# Altium integrated library Weidmueller_OMNIMATE_Power.IntLib: 508 symbols (part 2 of 9)
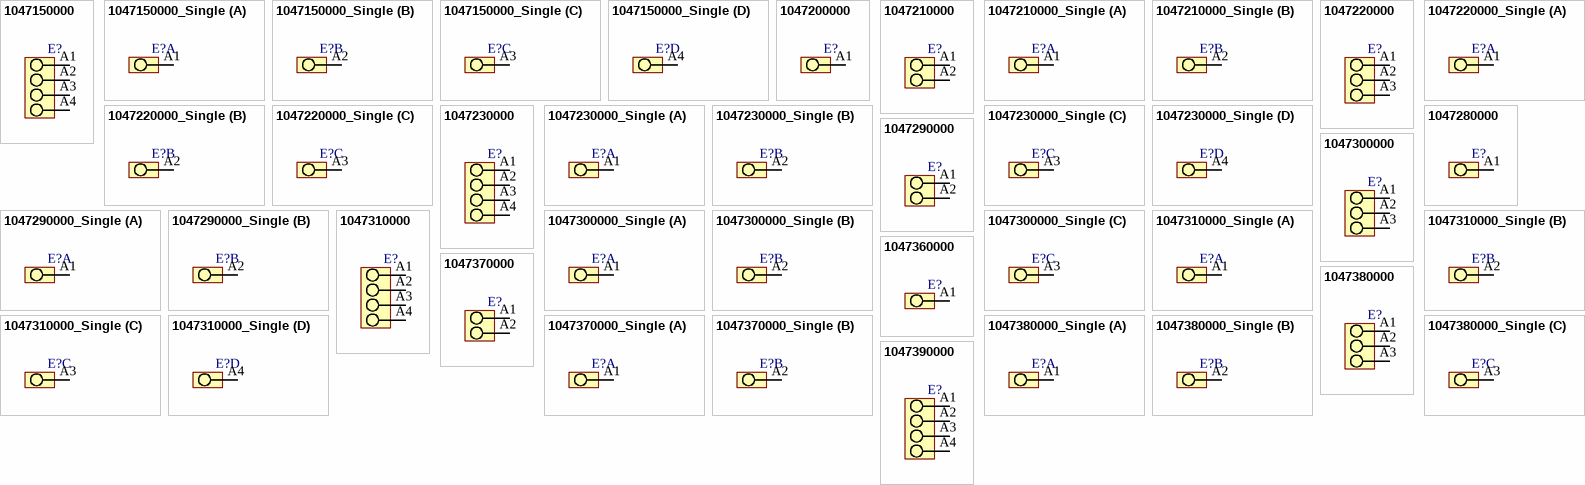
[diagram p32: symbols 1047150000 to 1047390000]

## 1047380000
designator E?
OMNIMATE Power - series LXXX; PartNumber: 1047380000; Manufacturer: Weidmueller; Short_text_for_material: LXXX 15.00/03/90F 4.5SN GY BX; Side_termination_characteristic: Flange; Mounting_onto_the_PCB: Solder connection; Pitch_mm: 15 mm; Pitch_inch: 0,591 inch; No_of_poles: 3; Solder_pin_length_mm: 4,5 mm; Contact_material: Cu-Leg; Contact_surface: tinned; Insulating_material: Wemid (PA); UL_94_flammability_rating: V-0; Rated_voltage_for_surge_voltage_class_pollution_degree_II_2: 1000 V; Rated_current_min_no_of_poles_TU_20_deg_C: 150 A; Solid_min_H05_07_V_U: 0,5 mm²; Solid_max_H05_07_V_U: 16 mm²; Rated_voltage_use_group_B_UL_1059: 600 V; Rated_current_use_group_B_UL_1059: 127 A; Wire_cross_section_AWG_min_UL_1059: AWG 20; Wire_cross_section_AWG_max_UL_1059: AWG 1; PackageReference: LXXX_15_00_90F_03; Colour: Pebble grey; Packaging: Box; Qty: 10 PCS; Revision: V1; ComponentLink1Description: Manufacturer URL; ComponentLink1URL: http://www.weidmueller.com/; ComponentLink2Description: URL Link1; ComponentLink2URL: http://catalog.weidmueller.com/catalog/Start.do?localeId=en&ObjectID=1047380000
footprint LXXX_15_00_90F_03 (OMNIMATE Power - Serie LXXX  LXXX 15.00/03/90F 4.5)
pins: A1, A2, A3
1 alternate drawing of the same symbol

## 1047380000_Single
designator E?
OMNIMATE Power - series LXXX; PartNumber: 1047380000; Manufacturer: Weidmueller; Short_text_for_material: LXXX 15.00/03/90F 4.5SN GY BX; Side_termination_characteristic: Flange; Mounting_onto_the_PCB: Solder connection; Pitch_mm: 15 mm; Pitch_inch: 0,591 inch; No_of_poles: 3; Solder_pin_length_mm: 4,5 mm; Contact_material: Cu-Leg; Contact_surface: tinned; Insulating_material: Wemid (PA); UL_94_flammability_rating: V-0; Rated_voltage_for_surge_voltage_class_pollution_degree_II_2: 1000 V; Rated_current_min_no_of_poles_TU_20_deg_C: 150 A; Solid_min_H05_07_V_U: 0,5 mm²; Solid_max_H05_07_V_U: 16 mm²; Rated_voltage_use_group_B_UL_1059: 600 V; Rated_current_use_group_B_UL_1059: 127 A; Wire_cross_section_AWG_min_UL_1059: AWG 20; Wire_cross_section_AWG_max_UL_1059: AWG 1; PackageReference: LXXX_15_00_90F_03; Colour: Pebble grey; Packaging: Box; Qty: 10 PCS; Revision: V1; ComponentLink1Description: Manufacturer URL; ComponentLink1URL: http://www.weidmueller.com/; ComponentLink2Description: URL Link1; ComponentLink2URL: http://catalog.weidmueller.com/catalog/Start.do?localeId=en&ObjectID=1047380000
footprint LXXX_15_00_90F_03 (OMNIMATE Power - Serie LXXX  LXXX 15.00/03/90F 4.5)
part A pins: A1
part B pins: A2
part C pins: A3
1 alternate drawing of the same symbol

## 1047390000
designator E?
OMNIMATE Power - series LXXX; PartNumber: 1047390000; Manufacturer: Weidmueller; Short_text_for_material: LXXX 15.00/04/90F 4.5SN GY BX; Side_termination_characteristic: Flange; Mounting_onto_the_PCB: Solder connection; Pitch_mm: 15 mm; Pitch_inch: 0,591 inch; No_of_poles: 4; Solder_pin_length_mm: 4,5 mm; Contact_material: Cu-Leg; Contact_surface: tinned; Insulating_material: Wemid (PA); UL_94_flammability_rating: V-0; Rated_voltage_for_surge_voltage_class_pollution_degree_II_2: 1000 V; Rated_current_min_no_of_poles_TU_20_deg_C: 150 A; Solid_min_H05_07_V_U: 0,5 mm²; Solid_max_H05_07_V_U: 16 mm²; Rated_voltage_use_group_B_UL_1059: 600 V; Rated_current_use_group_B_UL_1059: 127 A; Wire_cross_section_AWG_min_UL_1059: AWG 20; Wire_cross_section_AWG_max_UL_1059: AWG 1; PackageReference: LXXX_15_00_90F_04; Colour: Pebble grey; Packaging: Box; Qty: 10 PCS; Revision: V1; ComponentLink1Description: Manufacturer URL; ComponentLink1URL: http://www.weidmueller.com/; ComponentLink2Description: URL Link1; ComponentLink2URL: http://catalog.weidmueller.com/catalog/Start.do?localeId=en&ObjectID=1047390000
footprint LXXX_15_00_90F_04 (OMNIMATE Power - Serie LXXX  LXXX 15.00/04/90F 4.5)
pins: A1, A2, A3, A4
1 alternate drawing of the same symbol

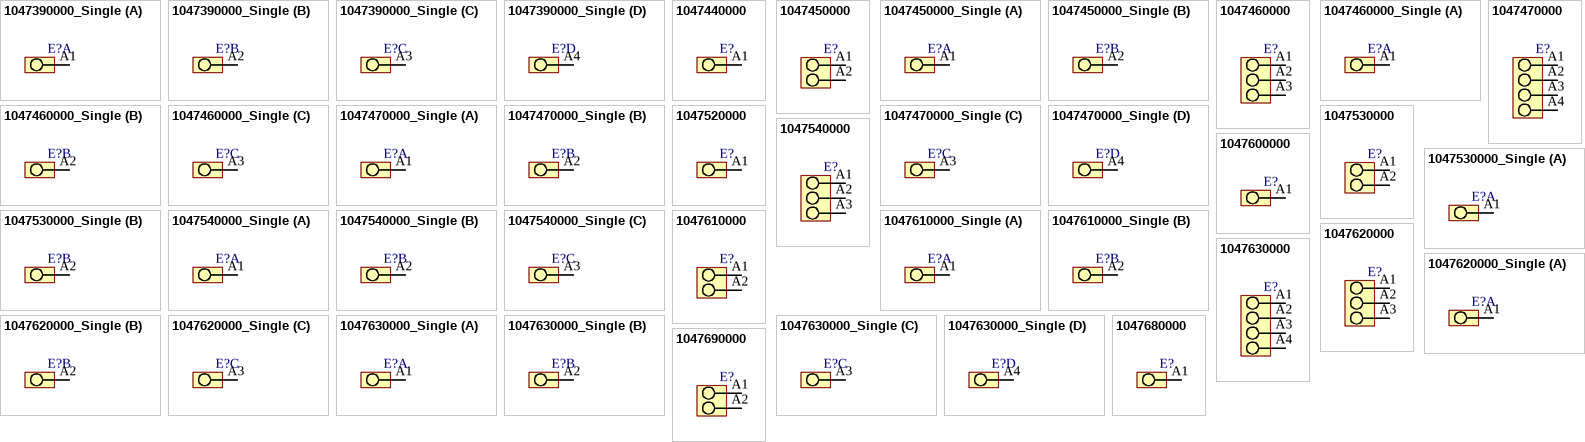
[diagram p3: symbols 1047390000_Single to 1047690000]

## 1047390000_Single
designator E?
OMNIMATE Power - series LXXX; PartNumber: 1047390000; Manufacturer: Weidmueller; Short_text_for_material: LXXX 15.00/04/90F 4.5SN GY BX; Side_termination_characteristic: Flange; Mounting_onto_the_PCB: Solder connection; Pitch_mm: 15 mm; Pitch_inch: 0,591 inch; No_of_poles: 4; Solder_pin_length_mm: 4,5 mm; Contact_material: Cu-Leg; Contact_surface: tinned; Insulating_material: Wemid (PA); UL_94_flammability_rating: V-0; Rated_voltage_for_surge_voltage_class_pollution_degree_II_2: 1000 V; Rated_current_min_no_of_poles_TU_20_deg_C: 150 A; Solid_min_H05_07_V_U: 0,5 mm²; Solid_max_H05_07_V_U: 16 mm²; Rated_voltage_use_group_B_UL_1059: 600 V; Rated_current_use_group_B_UL_1059: 127 A; Wire_cross_section_AWG_min_UL_1059: AWG 20; Wire_cross_section_AWG_max_UL_1059: AWG 1; PackageReference: LXXX_15_00_90F_04; Colour: Pebble grey; Packaging: Box; Qty: 10 PCS; Revision: V1; ComponentLink1Description: Manufacturer URL; ComponentLink1URL: http://www.weidmueller.com/; ComponentLink2Description: URL Link1; ComponentLink2URL: http://catalog.weidmueller.com/catalog/Start.do?localeId=en&ObjectID=1047390000
footprint LXXX_15_00_90F_04 (OMNIMATE Power - Serie LXXX  LXXX 15.00/04/90F 4.5)
part A pins: A1
part B pins: A2
part C pins: A3
part D pins: A4
1 alternate drawing of the same symbol

## 1047440000
designator E?
OMNIMATE Power - series LXXX; PartNumber: 1047440000; Manufacturer: Weidmueller; Short_text_for_material: LXXX 15.00/01/90FL 4.5SN BK BX; Side_termination_characteristic: Flange on left; Mounting_onto_the_PCB: Solder connection; Pitch_mm: 15 mm; Pitch_inch: 0,591 inch; No_of_poles: 1; Solder_pin_length_mm: 4,5 mm; Contact_material: Cu-Leg; Contact_surface: tinned; Insulating_material: Wemid (PA); UL_94_flammability_rating: V-0; Rated_voltage_for_surge_voltage_class_pollution_degree_II_2: 1000 V; Solid_min_H05_07_V_U: 0,5 mm²; Solid_max_H05_07_V_U: 16 mm²; Rated_voltage_use_group_B_UL_1059: 600 V; Rated_current_use_group_B_UL_1059: 127 A; Wire_cross_section_AWG_min_UL_1059: AWG 20; Wire_cross_section_AWG_max_UL_1059: AWG 1; PackageReference: LXXX_15_00_90FL_01; Colour: Black; Packaging: Box; Qty: 20 PCS; Revision: V1; ComponentLink1Description: Manufacturer URL; ComponentLink1URL: http://www.weidmueller.com/; ComponentLink2Description: URL Link1; ComponentLink2URL: http://catalog.weidmueller.com/catalog/Start.do?localeId=en&ObjectID=1047440000
footprint LXXX_15_00_90FL_01 (OMNIMATE Power - Serie LXXX  LXXX 15.00/01/90FL 4.5)
pins: A1
1 alternate drawing of the same symbol

## 1047450000
designator E?
OMNIMATE Power - series LXXX; PartNumber: 1047450000; Manufacturer: Weidmueller; Short_text_for_material: LXXX 15.00/02/90FL 4.5SN BK BX; Side_termination_characteristic: Flange on left; Mounting_onto_the_PCB: Solder connection; Pitch_mm: 15 mm; Pitch_inch: 0,591 inch; No_of_poles: 2; Solder_pin_length_mm: 4,5 mm; Contact_material: Cu-Leg; Contact_surface: tinned; Insulating_material: Wemid (PA); UL_94_flammability_rating: V-0; Rated_voltage_for_surge_voltage_class_pollution_degree_II_2: 1000 V; Solid_min_H05_07_V_U: 0,5 mm²; Solid_max_H05_07_V_U: 16 mm²; Rated_voltage_use_group_B_UL_1059: 600 V; Rated_current_use_group_B_UL_1059: 127 A; Wire_cross_section_AWG_min_UL_1059: AWG 20; Wire_cross_section_AWG_max_UL_1059: AWG 1; PackageReference: LXXX_15_00_90FL_02; Colour: Black; Packaging: Box; Qty: 20 PCS; Revision: V1; ComponentLink1Description: Manufacturer URL; ComponentLink1URL: http://www.weidmueller.com/; ComponentLink2Description: URL Link1; ComponentLink2URL: http://catalog.weidmueller.com/catalog/Start.do?localeId=en&ObjectID=1047450000
footprint LXXX_15_00_90FL_02 (OMNIMATE Power - Serie LXXX  LXXX 15.00/02/90FL 4.5)
pins: A1, A2
1 alternate drawing of the same symbol

## 1047450000_Single
designator E?
OMNIMATE Power - series LXXX; PartNumber: 1047450000; Manufacturer: Weidmueller; Short_text_for_material: LXXX 15.00/02/90FL 4.5SN BK BX; Side_termination_characteristic: Flange on left; Mounting_onto_the_PCB: Solder connection; Pitch_mm: 15 mm; Pitch_inch: 0,591 inch; No_of_poles: 2; Solder_pin_length_mm: 4,5 mm; Contact_material: Cu-Leg; Contact_surface: tinned; Insulating_material: Wemid (PA); UL_94_flammability_rating: V-0; Rated_voltage_for_surge_voltage_class_pollution_degree_II_2: 1000 V; Solid_min_H05_07_V_U: 0,5 mm²; Solid_max_H05_07_V_U: 16 mm²; Rated_voltage_use_group_B_UL_1059: 600 V; Rated_current_use_group_B_UL_1059: 127 A; Wire_cross_section_AWG_min_UL_1059: AWG 20; Wire_cross_section_AWG_max_UL_1059: AWG 1; PackageReference: LXXX_15_00_90FL_02; Colour: Black; Packaging: Box; Qty: 20 PCS; Revision: V1; ComponentLink1Description: Manufacturer URL; ComponentLink1URL: http://www.weidmueller.com/; ComponentLink2Description: URL Link1; ComponentLink2URL: http://catalog.weidmueller.com/catalog/Start.do?localeId=en&ObjectID=1047450000
footprint LXXX_15_00_90FL_02 (OMNIMATE Power - Serie LXXX  LXXX 15.00/02/90FL 4.5)
part A pins: A1
part B pins: A2
1 alternate drawing of the same symbol

## 1047460000
designator E?
OMNIMATE Power - series LXXX; PartNumber: 1047460000; Manufacturer: Weidmueller; Short_text_for_material: LXXX 15.00/03/90FL 4.5SN BK BX; Side_termination_characteristic: Flange on left; Mounting_onto_the_PCB: Solder connection; Pitch_mm: 15 mm; Pitch_inch: 0,591 inch; No_of_poles: 3; Solder_pin_length_mm: 4,5 mm; Contact_material: Cu-Leg; Contact_surface: tinned; Insulating_material: Wemid (PA); UL_94_flammability_rating: V-0; Rated_voltage_for_surge_voltage_class_pollution_degree_II_2: 1000 V; Solid_min_H05_07_V_U: 0,5 mm²; Solid_max_H05_07_V_U: 16 mm²; Rated_voltage_use_group_B_UL_1059: 600 V; Rated_current_use_group_B_UL_1059: 127 A; Wire_cross_section_AWG_min_UL_1059: AWG 20; Wire_cross_section_AWG_max_UL_1059: AWG 1; PackageReference: LXXX_15_00_90FL_03; Colour: Black; Packaging: Box; Qty: 10 PCS; Revision: V1; ComponentLink1Description: Manufacturer URL; ComponentLink1URL: http://www.weidmueller.com/; ComponentLink2Description: URL Link1; ComponentLink2URL: http://catalog.weidmueller.com/catalog/Start.do?localeId=en&ObjectID=1047460000
footprint LXXX_15_00_90FL_03 (OMNIMATE Power - Serie LXXX  LXXX 15.00/03/90FL 4.5)
pins: A1, A2, A3
1 alternate drawing of the same symbol

## 1047460000_Single
designator E?
OMNIMATE Power - series LXXX; PartNumber: 1047460000; Manufacturer: Weidmueller; Short_text_for_material: LXXX 15.00/03/90FL 4.5SN BK BX; Side_termination_characteristic: Flange on left; Mounting_onto_the_PCB: Solder connection; Pitch_mm: 15 mm; Pitch_inch: 0,591 inch; No_of_poles: 3; Solder_pin_length_mm: 4,5 mm; Contact_material: Cu-Leg; Contact_surface: tinned; Insulating_material: Wemid (PA); UL_94_flammability_rating: V-0; Rated_voltage_for_surge_voltage_class_pollution_degree_II_2: 1000 V; Solid_min_H05_07_V_U: 0,5 mm²; Solid_max_H05_07_V_U: 16 mm²; Rated_voltage_use_group_B_UL_1059: 600 V; Rated_current_use_group_B_UL_1059: 127 A; Wire_cross_section_AWG_min_UL_1059: AWG 20; Wire_cross_section_AWG_max_UL_1059: AWG 1; PackageReference: LXXX_15_00_90FL_03; Colour: Black; Packaging: Box; Qty: 10 PCS; Revision: V1; ComponentLink1Description: Manufacturer URL; ComponentLink1URL: http://www.weidmueller.com/; ComponentLink2Description: URL Link1; ComponentLink2URL: http://catalog.weidmueller.com/catalog/Start.do?localeId=en&ObjectID=1047460000
footprint LXXX_15_00_90FL_03 (OMNIMATE Power - Serie LXXX  LXXX 15.00/03/90FL 4.5)
part A pins: A1
part B pins: A2
part C pins: A3
1 alternate drawing of the same symbol

## 1047470000
designator E?
OMNIMATE Power - series LXXX; PartNumber: 1047470000; Manufacturer: Weidmueller; Short_text_for_material: LXXX 15.00/04/90FL 4.5SN BK BX; Side_termination_characteristic: Flange on left; Mounting_onto_the_PCB: Solder connection; Pitch_mm: 15 mm; Pitch_inch: 0,591 inch; No_of_poles: 4; Solder_pin_length_mm: 4,5 mm; Contact_material: Cu-Leg; Contact_surface: tinned; Insulating_material: Wemid (PA); UL_94_flammability_rating: V-0; Rated_voltage_for_surge_voltage_class_pollution_degree_II_2: 1000 V; Solid_min_H05_07_V_U: 0,5 mm²; Solid_max_H05_07_V_U: 16 mm²; Rated_voltage_use_group_B_UL_1059: 600 V; Rated_current_use_group_B_UL_1059: 127 A; Wire_cross_section_AWG_min_UL_1059: AWG 20; Wire_cross_section_AWG_max_UL_1059: AWG 1; PackageReference: LXXX_15_00_90FL_04; Colour: Black; Packaging: Box; Qty: 10 PCS; Revision: V1; ComponentLink1Description: Manufacturer URL; ComponentLink1URL: http://www.weidmueller.com/; ComponentLink2Description: URL Link1; ComponentLink2URL: http://catalog.weidmueller.com/catalog/Start.do?localeId=en&ObjectID=1047470000
footprint LXXX_15_00_90FL_04 (OMNIMATE Power - Serie LXXX  LXXX 15.00/04/90FL 4.5)
pins: A1, A2, A3, A4
1 alternate drawing of the same symbol

## 1047470000_Single
designator E?
OMNIMATE Power - series LXXX; PartNumber: 1047470000; Manufacturer: Weidmueller; Short_text_for_material: LXXX 15.00/04/90FL 4.5SN BK BX; Side_termination_characteristic: Flange on left; Mounting_onto_the_PCB: Solder connection; Pitch_mm: 15 mm; Pitch_inch: 0,591 inch; No_of_poles: 4; Solder_pin_length_mm: 4,5 mm; Contact_material: Cu-Leg; Contact_surface: tinned; Insulating_material: Wemid (PA); UL_94_flammability_rating: V-0; Rated_voltage_for_surge_voltage_class_pollution_degree_II_2: 1000 V; Solid_min_H05_07_V_U: 0,5 mm²; Solid_max_H05_07_V_U: 16 mm²; Rated_voltage_use_group_B_UL_1059: 600 V; Rated_current_use_group_B_UL_1059: 127 A; Wire_cross_section_AWG_min_UL_1059: AWG 20; Wire_cross_section_AWG_max_UL_1059: AWG 1; PackageReference: LXXX_15_00_90FL_04; Colour: Black; Packaging: Box; Qty: 10 PCS; Revision: V1; ComponentLink1Description: Manufacturer URL; ComponentLink1URL: http://www.weidmueller.com/; ComponentLink2Description: URL Link1; ComponentLink2URL: http://catalog.weidmueller.com/catalog/Start.do?localeId=en&ObjectID=1047470000
footprint LXXX_15_00_90FL_04 (OMNIMATE Power - Serie LXXX  LXXX 15.00/04/90FL 4.5)
part A pins: A1
part B pins: A2
part C pins: A3
part D pins: A4
1 alternate drawing of the same symbol

## 1047520000
designator E?
OMNIMATE Power - series LXXX; PartNumber: 1047520000; Manufacturer: Weidmueller; Short_text_for_material: LXXX 15.00/01/90FL 4.5SN GY BX; Side_termination_characteristic: Flange on left; Mounting_onto_the_PCB: Solder connection; Pitch_mm: 15 mm; Pitch_inch: 0,591 inch; No_of_poles: 1; Solder_pin_length_mm: 4,5 mm; Contact_material: Cu-Leg; Contact_surface: tinned; Insulating_material: Wemid (PA); UL_94_flammability_rating: V-0; Rated_voltage_for_surge_voltage_class_pollution_degree_II_2: 1000 V; Rated_current_min_no_of_poles_TU_20_deg_C: 150 A; Solid_min_H05_07_V_U: 0,5 mm²; Solid_max_H05_07_V_U: 16 mm²; Rated_voltage_use_group_B_UL_1059: 600 V; Rated_current_use_group_B_UL_1059: 127 A; Wire_cross_section_AWG_min_UL_1059: AWG 20; Wire_cross_section_AWG_max_UL_1059: AWG 1; PackageReference: LXXX_15_00_90FL_01; Colour: Pebble grey; Packaging: Box; Qty: 20 PCS; Revision: V1; ComponentLink1Description: Manufacturer URL; ComponentLink1URL: http://www.weidmueller.com/; ComponentLink2Description: URL Link1; ComponentLink2URL: http://catalog.weidmueller.com/catalog/Start.do?localeId=en&ObjectID=1047520000
footprint LXXX_15_00_90FL_01 (OMNIMATE Power - Serie LXXX  LXXX 15.00/01/90FL 4.5)
pins: A1
1 alternate drawing of the same symbol

## 1047530000
designator E?
OMNIMATE Power - series LXXX; PartNumber: 1047530000; Manufacturer: Weidmueller; Short_text_for_material: LXXX 15.00/02/90FL 4.5SN GY BX; Side_termination_characteristic: Flange on left; Mounting_onto_the_PCB: Solder connection; Pitch_mm: 15 mm; Pitch_inch: 0,591 inch; No_of_poles: 2; Solder_pin_length_mm: 4,5 mm; Contact_material: Cu-Leg; Contact_surface: tinned; Insulating_material: Wemid (PA); UL_94_flammability_rating: V-0; Rated_voltage_for_surge_voltage_class_pollution_degree_II_2: 1000 V; Rated_current_min_no_of_poles_TU_20_deg_C: 150 A; Solid_min_H05_07_V_U: 0,5 mm²; Solid_max_H05_07_V_U: 16 mm²; Rated_voltage_use_group_B_UL_1059: 600 V; Rated_current_use_group_B_UL_1059: 127 A; Wire_cross_section_AWG_min_UL_1059: AWG 20; Wire_cross_section_AWG_max_UL_1059: AWG 1; PackageReference: LXXX_15_00_90FL_02; Colour: Pebble grey; Packaging: Box; Qty: 20 PCS; Revision: V1; ComponentLink1Description: Manufacturer URL; ComponentLink1URL: http://www.weidmueller.com/; ComponentLink2Description: URL Link1; ComponentLink2URL: http://catalog.weidmueller.com/catalog/Start.do?localeId=en&ObjectID=1047530000
footprint LXXX_15_00_90FL_02 (OMNIMATE Power - Serie LXXX  LXXX 15.00/02/90FL 4.5)
pins: A1, A2
1 alternate drawing of the same symbol

## 1047530000_Single
designator E?
OMNIMATE Power - series LXXX; PartNumber: 1047530000; Manufacturer: Weidmueller; Short_text_for_material: LXXX 15.00/02/90FL 4.5SN GY BX; Side_termination_characteristic: Flange on left; Mounting_onto_the_PCB: Solder connection; Pitch_mm: 15 mm; Pitch_inch: 0,591 inch; No_of_poles: 2; Solder_pin_length_mm: 4,5 mm; Contact_material: Cu-Leg; Contact_surface: tinned; Insulating_material: Wemid (PA); UL_94_flammability_rating: V-0; Rated_voltage_for_surge_voltage_class_pollution_degree_II_2: 1000 V; Rated_current_min_no_of_poles_TU_20_deg_C: 150 A; Solid_min_H05_07_V_U: 0,5 mm²; Solid_max_H05_07_V_U: 16 mm²; Rated_voltage_use_group_B_UL_1059: 600 V; Rated_current_use_group_B_UL_1059: 127 A; Wire_cross_section_AWG_min_UL_1059: AWG 20; Wire_cross_section_AWG_max_UL_1059: AWG 1; PackageReference: LXXX_15_00_90FL_02; Colour: Pebble grey; Packaging: Box; Qty: 20 PCS; Revision: V1; ComponentLink1Description: Manufacturer URL; ComponentLink1URL: http://www.weidmueller.com/; ComponentLink2Description: URL Link1; ComponentLink2URL: http://catalog.weidmueller.com/catalog/Start.do?localeId=en&ObjectID=1047530000
footprint LXXX_15_00_90FL_02 (OMNIMATE Power - Serie LXXX  LXXX 15.00/02/90FL 4.5)
part A pins: A1
part B pins: A2
1 alternate drawing of the same symbol

## 1047540000
designator E?
OMNIMATE Power - series LXXX; PartNumber: 1047540000; Manufacturer: Weidmueller; Short_text_for_material: LXXX 15.00/03/90FL 4.5SN GY BX; Side_termination_characteristic: Flange on left; Mounting_onto_the_PCB: Solder connection; Pitch_mm: 15 mm; Pitch_inch: 0,591 inch; No_of_poles: 3; Solder_pin_length_mm: 4,5 mm; Contact_material: Cu-Leg; Contact_surface: tinned; Insulating_material: Wemid (PA); UL_94_flammability_rating: V-0; Rated_voltage_for_surge_voltage_class_pollution_degree_II_2: 1000 V; Rated_current_min_no_of_poles_TU_20_deg_C: 150 A; Solid_min_H05_07_V_U: 0,5 mm²; Solid_max_H05_07_V_U: 16 mm²; Rated_voltage_use_group_B_UL_1059: 600 V; Rated_current_use_group_B_UL_1059: 127 A; Wire_cross_section_AWG_min_UL_1059: AWG 20; Wire_cross_section_AWG_max_UL_1059: AWG 1; PackageReference: LXXX_15_00_90FL_03; Colour: Pebble grey; Packaging: Box; Qty: 10 PCS; Revision: V1; ComponentLink1Description: Manufacturer URL; ComponentLink1URL: http://www.weidmueller.com/; ComponentLink2Description: URL Link1; ComponentLink2URL: http://catalog.weidmueller.com/catalog/Start.do?localeId=en&ObjectID=1047540000
footprint LXXX_15_00_90FL_03 (OMNIMATE Power - Serie LXXX  LXXX 15.00/03/90FL 4.5)
pins: A1, A2, A3
1 alternate drawing of the same symbol

## 1047540000_Single
designator E?
OMNIMATE Power - series LXXX; PartNumber: 1047540000; Manufacturer: Weidmueller; Short_text_for_material: LXXX 15.00/03/90FL 4.5SN GY BX; Side_termination_characteristic: Flange on left; Mounting_onto_the_PCB: Solder connection; Pitch_mm: 15 mm; Pitch_inch: 0,591 inch; No_of_poles: 3; Solder_pin_length_mm: 4,5 mm; Contact_material: Cu-Leg; Contact_surface: tinned; Insulating_material: Wemid (PA); UL_94_flammability_rating: V-0; Rated_voltage_for_surge_voltage_class_pollution_degree_II_2: 1000 V; Rated_current_min_no_of_poles_TU_20_deg_C: 150 A; Solid_min_H05_07_V_U: 0,5 mm²; Solid_max_H05_07_V_U: 16 mm²; Rated_voltage_use_group_B_UL_1059: 600 V; Rated_current_use_group_B_UL_1059: 127 A; Wire_cross_section_AWG_min_UL_1059: AWG 20; Wire_cross_section_AWG_max_UL_1059: AWG 1; PackageReference: LXXX_15_00_90FL_03; Colour: Pebble grey; Packaging: Box; Qty: 10 PCS; Revision: V1; ComponentLink1Description: Manufacturer URL; ComponentLink1URL: http://www.weidmueller.com/; ComponentLink2Description: URL Link1; ComponentLink2URL: http://catalog.weidmueller.com/catalog/Start.do?localeId=en&ObjectID=1047540000
footprint LXXX_15_00_90FL_03 (OMNIMATE Power - Serie LXXX  LXXX 15.00/03/90FL 4.5)
part A pins: A1
part B pins: A2
part C pins: A3
1 alternate drawing of the same symbol

## 1047600000
designator E?
OMNIMATE Power - series LXXX; PartNumber: 1047600000; Manufacturer: Weidmueller; Short_text_for_material: LXXX 15.00/01/90FR 4.5SN BK BX; Side_termination_characteristic: Flange right; Mounting_onto_the_PCB: Solder connection; Pitch_mm: 15 mm; Pitch_inch: 0,591 inch; No_of_poles: 1; Solder_pin_length_mm: 4,5 mm; Contact_material: Cu-Leg; Contact_surface: tinned; Insulating_material: Wemid (PA); UL_94_flammability_rating: V-0; Rated_voltage_for_surge_voltage_class_pollution_degree_II_2: 1000 V; Solid_min_H05_07_V_U: 0,5 mm²; Solid_max_H05_07_V_U: 16 mm²; Rated_voltage_use_group_B_UL_1059: 600 V; Rated_current_use_group_B_UL_1059: 127 A; Wire_cross_section_AWG_min_UL_1059: AWG 20; Wire_cross_section_AWG_max_UL_1059: AWG 1; PackageReference: LXXX_15_00_90FR_01; Colour: Black; Packaging: Box; Qty: 20 PCS; Revision: V1; ComponentLink1Description: Manufacturer URL; ComponentLink1URL: http://www.weidmueller.com/; ComponentLink2Description: URL Link1; ComponentLink2URL: http://catalog.weidmueller.com/catalog/Start.do?localeId=en&ObjectID=1047600000
footprint LXXX_15_00_90FR_01 (OMNIMATE Power - Serie LXXX  LXXX 15.00/01/90FR 4.5)
pins: A1
1 alternate drawing of the same symbol

## 1047610000
designator E?
OMNIMATE Power - series LXXX; PartNumber: 1047610000; Manufacturer: Weidmueller; Short_text_for_material: LXXX 15.00/02/90FR 4.5SN BK BX; Side_termination_characteristic: Flange right; Mounting_onto_the_PCB: Solder connection; Pitch_mm: 15 mm; Pitch_inch: 0,591 inch; No_of_poles: 2; Solder_pin_length_mm: 4,5 mm; Contact_material: Cu-Leg; Contact_surface: tinned; Insulating_material: Wemid (PA); UL_94_flammability_rating: V-0; Rated_voltage_for_surge_voltage_class_pollution_degree_II_2: 1000 V; Solid_min_H05_07_V_U: 0,5 mm²; Solid_max_H05_07_V_U: 16 mm²; Rated_voltage_use_group_B_UL_1059: 600 V; Rated_current_use_group_B_UL_1059: 127 A; Wire_cross_section_AWG_min_UL_1059: AWG 20; Wire_cross_section_AWG_max_UL_1059: AWG 1; PackageReference: LXXX_15_00_90FR_02; Colour: Black; Packaging: Box; Qty: 20 PCS; Revision: V1; ComponentLink1Description: Manufacturer URL; ComponentLink1URL: http://www.weidmueller.com/; ComponentLink2Description: URL Link1; ComponentLink2URL: http://catalog.weidmueller.com/catalog/Start.do?localeId=en&ObjectID=1047610000
footprint LXXX_15_00_90FR_02 (OMNIMATE Power - Serie LXXX  LXXX 15.00/02/90FR 4.5)
pins: A1, A2
1 alternate drawing of the same symbol

## 1047610000_Single
designator E?
OMNIMATE Power - series LXXX; PartNumber: 1047610000; Manufacturer: Weidmueller; Short_text_for_material: LXXX 15.00/02/90FR 4.5SN BK BX; Side_termination_characteristic: Flange right; Mounting_onto_the_PCB: Solder connection; Pitch_mm: 15 mm; Pitch_inch: 0,591 inch; No_of_poles: 2; Solder_pin_length_mm: 4,5 mm; Contact_material: Cu-Leg; Contact_surface: tinned; Insulating_material: Wemid (PA); UL_94_flammability_rating: V-0; Rated_voltage_for_surge_voltage_class_pollution_degree_II_2: 1000 V; Solid_min_H05_07_V_U: 0,5 mm²; Solid_max_H05_07_V_U: 16 mm²; Rated_voltage_use_group_B_UL_1059: 600 V; Rated_current_use_group_B_UL_1059: 127 A; Wire_cross_section_AWG_min_UL_1059: AWG 20; Wire_cross_section_AWG_max_UL_1059: AWG 1; PackageReference: LXXX_15_00_90FR_02; Colour: Black; Packaging: Box; Qty: 20 PCS; Revision: V1; ComponentLink1Description: Manufacturer URL; ComponentLink1URL: http://www.weidmueller.com/; ComponentLink2Description: URL Link1; ComponentLink2URL: http://catalog.weidmueller.com/catalog/Start.do?localeId=en&ObjectID=1047610000
footprint LXXX_15_00_90FR_02 (OMNIMATE Power - Serie LXXX  LXXX 15.00/02/90FR 4.5)
part A pins: A1
part B pins: A2
1 alternate drawing of the same symbol

## 1047620000
designator E?
OMNIMATE Power - series LXXX; PartNumber: 1047620000; Manufacturer: Weidmueller; Short_text_for_material: LXXX 15.00/03/90FR 4.5SN BK BX; Side_termination_characteristic: Flange right; Mounting_onto_the_PCB: Solder connection; Pitch_mm: 15 mm; Pitch_inch: 0,591 inch; No_of_poles: 3; Solder_pin_length_mm: 4,5 mm; Contact_material: Cu-Leg; Contact_surface: tinned; Insulating_material: Wemid (PA); UL_94_flammability_rating: V-0; Rated_voltage_for_surge_voltage_class_pollution_degree_II_2: 1000 V; Solid_min_H05_07_V_U: 0,5 mm²; Solid_max_H05_07_V_U: 16 mm²; Rated_voltage_use_group_B_UL_1059: 600 V; Rated_current_use_group_B_UL_1059: 127 A; Wire_cross_section_AWG_min_UL_1059: AWG 20; Wire_cross_section_AWG_max_UL_1059: AWG 1; PackageReference: LXXX_15_00_90FR_03; Colour: Black; Packaging: Box; Qty: 10 PCS; Revision: V1; ComponentLink1Description: Manufacturer URL; ComponentLink1URL: http://www.weidmueller.com/; ComponentLink2Description: URL Link1; ComponentLink2URL: http://catalog.weidmueller.com/catalog/Start.do?localeId=en&ObjectID=1047620000
footprint LXXX_15_00_90FR_03 (OMNIMATE Power - Serie LXXX  LXXX 15.00/03/90FR 4.5)
pins: A1, A2, A3
1 alternate drawing of the same symbol

## 1047620000_Single
designator E?
OMNIMATE Power - series LXXX; PartNumber: 1047620000; Manufacturer: Weidmueller; Short_text_for_material: LXXX 15.00/03/90FR 4.5SN BK BX; Side_termination_characteristic: Flange right; Mounting_onto_the_PCB: Solder connection; Pitch_mm: 15 mm; Pitch_inch: 0,591 inch; No_of_poles: 3; Solder_pin_length_mm: 4,5 mm; Contact_material: Cu-Leg; Contact_surface: tinned; Insulating_material: Wemid (PA); UL_94_flammability_rating: V-0; Rated_voltage_for_surge_voltage_class_pollution_degree_II_2: 1000 V; Solid_min_H05_07_V_U: 0,5 mm²; Solid_max_H05_07_V_U: 16 mm²; Rated_voltage_use_group_B_UL_1059: 600 V; Rated_current_use_group_B_UL_1059: 127 A; Wire_cross_section_AWG_min_UL_1059: AWG 20; Wire_cross_section_AWG_max_UL_1059: AWG 1; PackageReference: LXXX_15_00_90FR_03; Colour: Black; Packaging: Box; Qty: 10 PCS; Revision: V1; ComponentLink1Description: Manufacturer URL; ComponentLink1URL: http://www.weidmueller.com/; ComponentLink2Description: URL Link1; ComponentLink2URL: http://catalog.weidmueller.com/catalog/Start.do?localeId=en&ObjectID=1047620000
footprint LXXX_15_00_90FR_03 (OMNIMATE Power - Serie LXXX  LXXX 15.00/03/90FR 4.5)
part A pins: A1
part B pins: A2
part C pins: A3
1 alternate drawing of the same symbol

## 1047630000
designator E?
OMNIMATE Power - series LXXX; PartNumber: 1047630000; Manufacturer: Weidmueller; Short_text_for_material: LXXX 15.00/04/90FR 4.5SN BK BX; Side_termination_characteristic: Flange right; Mounting_onto_the_PCB: Solder connection; Pitch_mm: 15 mm; Pitch_inch: 0,591 inch; No_of_poles: 4; Solder_pin_length_mm: 4,5 mm; Contact_material: Cu-Leg; Contact_surface: tinned; Insulating_material: Wemid (PA); UL_94_flammability_rating: V-0; Rated_voltage_for_surge_voltage_class_pollution_degree_II_2: 1000 V; Solid_min_H05_07_V_U: 0,5 mm²; Solid_max_H05_07_V_U: 16 mm²; Rated_voltage_use_group_B_UL_1059: 600 V; Rated_current_use_group_B_UL_1059: 127 A; Wire_cross_section_AWG_min_UL_1059: AWG 20; Wire_cross_section_AWG_max_UL_1059: AWG 1; PackageReference: LXXX_15_00_90FR_04; Colour: Black; Packaging: Box; Qty: 10 PCS; Revision: V1; ComponentLink1Description: Manufacturer URL; ComponentLink1URL: http://www.weidmueller.com/; ComponentLink2Description: URL Link1; ComponentLink2URL: http://catalog.weidmueller.com/catalog/Start.do?localeId=en&ObjectID=1047630000
footprint LXXX_15_00_90FR_04 (OMNIMATE Power - Serie LXXX  LXXX 15.00/04/90FR 4.5)
pins: A1, A2, A3, A4
1 alternate drawing of the same symbol

## 1047630000_Single
designator E?
OMNIMATE Power - series LXXX; PartNumber: 1047630000; Manufacturer: Weidmueller; Short_text_for_material: LXXX 15.00/04/90FR 4.5SN BK BX; Side_termination_characteristic: Flange right; Mounting_onto_the_PCB: Solder connection; Pitch_mm: 15 mm; Pitch_inch: 0,591 inch; No_of_poles: 4; Solder_pin_length_mm: 4,5 mm; Contact_material: Cu-Leg; Contact_surface: tinned; Insulating_material: Wemid (PA); UL_94_flammability_rating: V-0; Rated_voltage_for_surge_voltage_class_pollution_degree_II_2: 1000 V; Solid_min_H05_07_V_U: 0,5 mm²; Solid_max_H05_07_V_U: 16 mm²; Rated_voltage_use_group_B_UL_1059: 600 V; Rated_current_use_group_B_UL_1059: 127 A; Wire_cross_section_AWG_min_UL_1059: AWG 20; Wire_cross_section_AWG_max_UL_1059: AWG 1; PackageReference: LXXX_15_00_90FR_04; Colour: Black; Packaging: Box; Qty: 10 PCS; Revision: V1; ComponentLink1Description: Manufacturer URL; ComponentLink1URL: http://www.weidmueller.com/; ComponentLink2Description: URL Link1; ComponentLink2URL: http://catalog.weidmueller.com/catalog/Start.do?localeId=en&ObjectID=1047630000
footprint LXXX_15_00_90FR_04 (OMNIMATE Power - Serie LXXX  LXXX 15.00/04/90FR 4.5)
part A pins: A1
part B pins: A2
part C pins: A3
part D pins: A4
1 alternate drawing of the same symbol

## 1047680000
designator E?
OMNIMATE Power - series LXXX; PartNumber: 1047680000; Manufacturer: Weidmueller; Short_text_for_material: LXXX 15.00/01/90FR 4.5SN GY BX; Side_termination_characteristic: Flange right; Mounting_onto_the_PCB: Solder connection; Pitch_mm: 15 mm; Pitch_inch: 0,591 inch; No_of_poles: 1; Solder_pin_length_mm: 4,5 mm; Contact_material: Cu-Leg; Contact_surface: tinned; Insulating_material: Wemid (PA); UL_94_flammability_rating: V-0; Rated_voltage_for_surge_voltage_class_pollution_degree_II_2: 1000 V; Rated_current_min_no_of_poles_TU_20_deg_C: 150 A; Solid_min_H05_07_V_U: 0,5 mm²; Solid_max_H05_07_V_U: 16 mm²; Rated_voltage_use_group_B_UL_1059: 600 V; Rated_current_use_group_B_UL_1059: 127 A; Wire_cross_section_AWG_min_UL_1059: AWG 20; Wire_cross_section_AWG_max_UL_1059: AWG 1; PackageReference: LXXX_15_00_90FR_01; Colour: Pebble grey; Packaging: Box; Qty: 20 PCS; Revision: V1; ComponentLink1Description: Manufacturer URL; ComponentLink1URL: http://www.weidmueller.com/; ComponentLink2Description: URL Link1; ComponentLink2URL: http://catalog.weidmueller.com/catalog/Start.do?localeId=en&ObjectID=1047680000
footprint LXXX_15_00_90FR_01 (OMNIMATE Power - Serie LXXX  LXXX 15.00/01/90FR 4.5)
pins: A1
1 alternate drawing of the same symbol

## 1047690000
designator E?
OMNIMATE Power - series LXXX; PartNumber: 1047690000; Manufacturer: Weidmueller; Short_text_for_material: LXXX 15.00/02/90FR 4.5SN GY BX; Side_termination_characteristic: Flange right; Mounting_onto_the_PCB: Solder connection; Pitch_mm: 15 mm; Pitch_inch: 0,591 inch; No_of_poles: 2; Solder_pin_length_mm: 4,5 mm; Contact_material: Cu-Leg; Contact_surface: tinned; Insulating_material: Wemid (PA); UL_94_flammability_rating: V-0; Rated_voltage_for_surge_voltage_class_pollution_degree_II_2: 1000 V; Rated_current_min_no_of_poles_TU_20_deg_C: 150 A; Solid_min_H05_07_V_U: 0,5 mm²; Solid_max_H05_07_V_U: 16 mm²; Rated_voltage_use_group_B_UL_1059: 600 V; Rated_current_use_group_B_UL_1059: 127 A; Wire_cross_section_AWG_min_UL_1059: AWG 20; Wire_cross_section_AWG_max_UL_1059: AWG 1; PackageReference: LXXX_15_00_90FR_02; Colour: Pebble grey; Packaging: Box; Qty: 20 PCS; Revision: V1; ComponentLink1Description: Manufacturer URL; ComponentLink1URL: http://www.weidmueller.com/; ComponentLink2Description: URL Link1; ComponentLink2URL: http://catalog.weidmueller.com/catalog/Start.do?localeId=en&ObjectID=1047690000
footprint LXXX_15_00_90FR_02 (OMNIMATE Power - Serie LXXX  LXXX 15.00/02/90FR 4.5)
pins: A1, A2
1 alternate drawing of the same symbol
